# Altium integrated library iMag.IntLib: 35 symbols
Pins are listed as number, name and electrical type; pins without a type are passive.

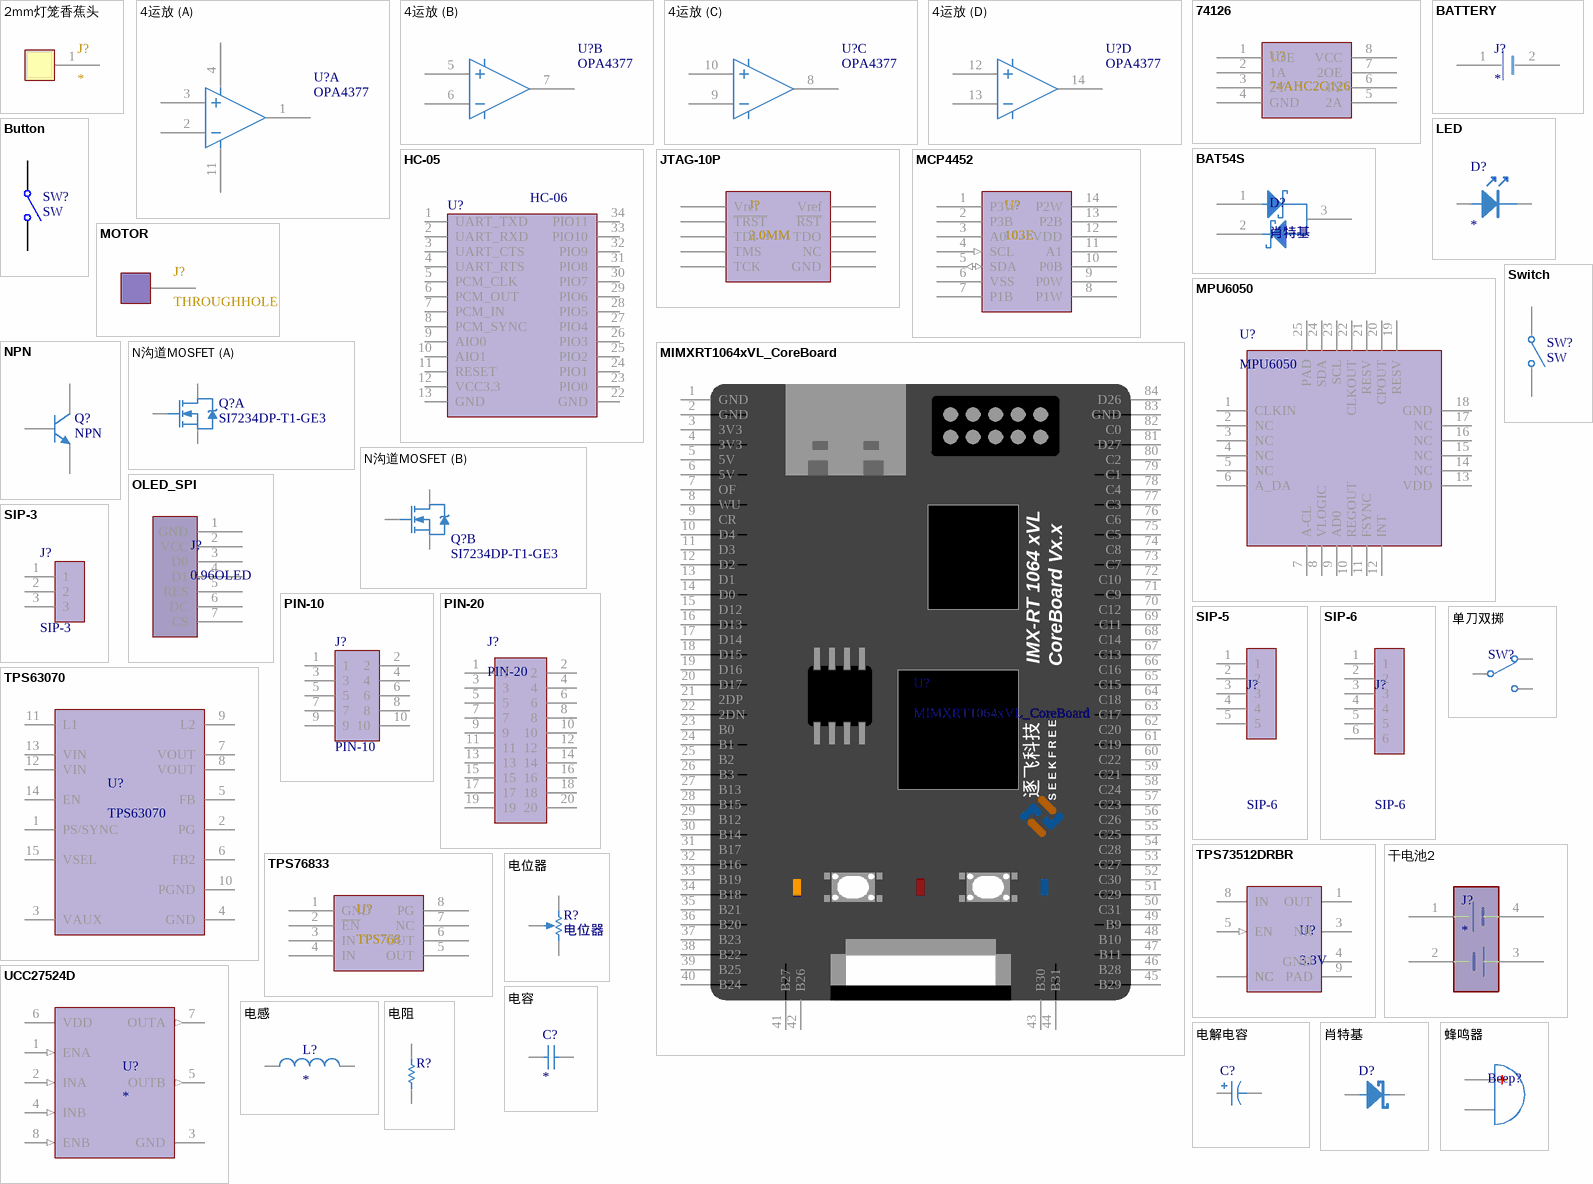
[diagram p0: symbols 2mm灯笼香蕉头 to 蜂鸣器]

## 2mm灯笼香蕉头
designator J?
footprint Model Name (Footprint not found)
footprint MOTOR (镀金香蕉头2mm)
pins: 1 0

## 4运放
designator U?, comment OPA4377
footprint DIP-14
footprint SOIC-14_150MIL
footprint TSSOP-14 (4.96x4.40x1.00 e=0.65（蒜米工坊）)
part A pins: 1, 2, 3, 4, 11
part B pins: 5, 6, 7
part C pins: 8, 9, 10
part D pins: 12, 13, 14

## 74126
designator U?, comment 74AHC2G126
footprint VSSOP-8
pins: 1 1OE, 2 1A, 3 2Y, 4 GND, 5 2A, 6 1Y, 7 2OE, 8 VCC

## BAT54S
designator D?, comment 肖特基
footprint SOT-23 (SOT-23-3)
pins: 1, 2, 3

## BATTERY
designator J?
footprint T接头
pins: 1 +, 2 +

## Button
designator SW?, comment SW
Single-Pole, Single-Throw Switch
footprint 按键微动开关2
footprint 侧按钮
pins: 1 COMMON, 2 NO

## HC-05
designator U?, comment HC-06
蓝牙串口模块
footprint HC-05 (HC-05/06/08V15)
pins: 1 UART_TXD, 2 UART_RXD, 3 UART_CTS, 4 UART_RTS, 5 PCM_CLK, 6 PCM_OUT, 7 PCM_IN, 8 PCM_SYNC, 9 AIO0, 10 AIO1, 11 RESET, 12 VCC3.3, 13 GND, 22 GND, 23 PIO0, 24 PIO1, 25 PIO2, 26 PIO3, 27 PIO4, 28 PIO5, 29 PIO6, 30 PIO7, 31 PIO8, 32 PIO9, 33 PIO10, 34 PIO11

## JTAG-10P
designator J?, comment 2.0MM
footprint IDC-10P
pins: 1 Vref, 2 Vref, 3 ~{TRST}, 4 ~{RST}, 5 TDI, 6 TDO, 7 TMS, 8 NC, 9 TCK, 10 GND

## LED
designator D?
LED
footprint LED 0603B (蓝色0603LED)
footprint LED 0603G (绿色0603LED)
footprint LED 0603R (红色0603LED)
footprint LED 0603W (白色0603LED)
footprint LED 0603Y (黄色0603LED)
footprint LED0805
footprint LED0805红色
footprint LED0805绿色
footprint LED0805黄色
footprint LED-SMD_L1.7-W0.6-RD
pins: A 1, K 2

## MCP4452
designator U?, comment 103E
footprint TSSOP-14 (4.96x4.40x1.00 e=0.65（蒜米工坊）)
pins: 1 P3W, 2 P3B, 3 A0, 4 SCL (in), 5 SDA (io), 6 VSS, 7 P1B, 8 P1W, 9 P0W, 10 P0B, 11 A1, 12 VDD, 13 P2B, 14 P2W

## MIMXRT1064xVL_CoreBoard
designator U?
逐飞科技i.MX RT1064核心板整体原理，可直接使用
footprint MIMXRT1064xVL_CoreBoard (逐飞科技i.MX RT1064核心板整体封装，可直接使用)
pins: 1 GND, 2 GND, 3 3V3, 4 3V3, 5 5V, 6 5V, 7 OF, 8 WU, 9 CR, 10 D4, 11 D3, 12 D2, 13 D1, 14 D0, 15 D12, 16 D13, 17 D14, 18 D15, 19 D16, 20 D17, 21 2DP, 22 2DN, 23 B0, 24 B1, 25 B2, 26 B3, 27 B13, 28 B15, 29 B12, 30 B14, 31 B17, 32 B16, 33 B19, 34 B18, 35 B21, 36 B20, 37 B23, 38 B22, 39 B25, 40 B24, 41 B27, 42 B26, 43 B30, 44 B31, 45 B29, 46 B28, 47 B11, 48 B10, 49 B9, 50 C31, 51 C29, 52 C30, 53 C27, 54 C28, 55 C25, 56 C26, 57 C23, 58 C24, 59 C21, 60 C22, 61 C19, 62 C20, 63 C17, 64 C18, 65 C15, 66 C16, 67 C13, 68 C14, 69 C11, 70 C12, 71 C9, 72 C10, 73 C7, 74 C8, 75 C5, 76 C6, 77 C3, 78 C4, 79 C1, 80 C2, 81 D27, 82 C0, 83 GND, 84 D26
text: IMX-RT 1064 xVL; CoreBoard Vx.x; 逐飞科技; S E E K F R E E

## MOTOR
designator J?, comment THROUGHHOLE
footprint MOTOR (镀金香蕉头2mm)
pins: 1

## MPU6050
designator U?
footprint QFN-24_4x4x05P
pins: 1 CLKIN, 2 NC, 3 NC, 4 NC, 5 NC, 6 A_DA, 7 A-CL, 8 VLOGIC, 9 AD0, 10 REGOUT, 11 FSYNC, 12 INT, 13 VDD, 14 NC, 15 NC, 16 NC, 17 NC, 18 GND, 19 RESV, 20 CPOUT, 21 RESV, 22 CLKOUT, 23 SCL, 24 SDA, 25 PAD

## NPN
designator Q?
NPN Bipolar Transistor; Published: 8-Jun-2000; LatestRevisionDate: 17-Jul-2002; LatestRevisionNote: Re-released for DXP Platform.; PackageReference: TO-226-AA; Publisher: Altium Limited; PackageDescription: TO, Flat Index; 3 In-Line, Axial Leads; Body Dia. 4.8mm; Leads 0.55 x 0.51 mm (max); Code_JEDEC: TO-226-AA
footprint SOT-23 (SOT-23-3)
simulation model NPN
signal-integrity model NPN
pins: 1 B, 2 E, 3 C

## N沟道MOSFET
designator Q?, comment SI7234DP-T1-GE3
CQ-BS170
footprint DFN-8EP2 (DFN-8_L5.5-W5.2-P1.27-LS6.0-BL-EP2)
part A pins: 1 S, 2 G, 6 D
part B pins: 3 S, 4 G, 5 D

## OLED_SPI
designator J?, comment 0.96OLED
footprint OLED 0.96
pins: 1 GND, 2 VCC, 3 D0, 4 D1, 5 RES, 6 DC, 7 CS

## PIN-10
designator J?
footprint 2.54简易牛角座10P
footprint 2.54简易牛角座弯针10P
footprint 2.54母排座双排10P
footprint 2.54弯排针2X5
footprint JTAG_10P
footprint 2.54排针2X5
pins: 1, 2, 3, 4, 5, 6, 7, 8, 9, 10

## PIN-20
designator J?
footprint 2.54排针2X10
footprint 2.54弯排针2X10
footprint 2.54简易牛角座20p
footprint 2.54简易牛角座弯针20P
footprint 2.54母排座双排20P
footprint 4.2接插件20P
footprint IDC-TH_2.0-2*10
pins: 1, 2, 3, 4, 5, 6, 7, 8, 9, 10, 11, 12, 13, 14, 15, 16, 17, 18, 19, 20

## SIP-3
designator J?
footprint 5.08接线端子3位
footprint 5.08接线端子3P
footprint 2.54接插件3P
footprint 2.54接插件3P
footprint 2.54排针1X3
footprint 2.54弯排针1X3-A
footprint 2.54弯排针1X3
footprint 2.54对插件3P
footprint 2.54XH接插件3P
footprint XH2.54-3SMD (CONN-SMD_3P-P2.54_XH2.54-3AB)
pins: 1, 2, 3

## SIP-5
designator J?, comment SIP-6
footprint 2.54排针1X5
pins: 1, 2, 3, 4, 5

## SIP-6
designator J?
footprint 5.08接线端子6位
footprint 5.08接插件6P
footprint 2.54接插件6P
footprint 2.54排针1X6
footprint 2.54弯排针1X6-A
footprint 2.54弯排针1X6
footprint 2.54对插件6P
footprint 2.54XH接插件6P
footprint 2.54简易牛角座6P
pins: 1, 2, 3, 4, 5, 6

## Switch
designator SW?, comment SW
Single-Pole, Single-Throw Switch
footprint 按键微动开关2
footprint 侧按钮
footprint 轻触开关6.2*6.2(5p) SMD
pins: 1 COMMON, 2 NO

## TPS63070
designator U?
footprint VQFN-15
pins: 1 PS/SYNC, 2 PG, 3 VAUX, 4 GND, 5 FB, 6 FB2, 7 VOUT, 8 VOUT, 9 L2, 10 PGND, 11 L1, 12 VIN, 13 VIN, 14 EN, 15 VSEL

## TPS73512DRBR
designator U?, comment 3.3V
No Description Available; PartNumber: TPS73512DRBR; Alternate_PartNumber: TPS73512DRBT; Manufacturer: Texas Instruments; CompType: IC; PIN_COUNT: 9; Application_BuildNumber: *; PackageReference: DRB0008A; MountType: SMT; RoHS: Y; RefDes: RefDes; Type: DEV; Value: Value; Copyright: Copyright (C) 2018 Accelerated Designs. All rights reserved
footprint VSON-8
pins: 1 OUT (power), 2 NC, 3 NR, 4 GND (power), 5 EN (in), 6 NC, 7 NC, 8 IN (power), 9 PAD (power)

## TPS76833
designator U?, comment TPS768
footprint SOIC8-3.9MM
pins: 1 GND, 2 ~{EN}, 3 IN, 4 IN, 5 OUT, 6 OUT, 7 NC, 8 PG

## UCC27524D
designator U?
No Description Available; PartNumber: UCC27524DR; Manufacturer: Texas Instruments; RefDes: RefDes; Type: DEV; Value: Value; Copyright: Copyright (C) 2018 Accelerated Designs. All rights reserved
footprint D0008A_N
footprint TSSOP-8EP (TSSOP-8_L3.0-W3.0-P0.65-LS4.9-BL-EP)
pins: 1 ENA (in), 2 INA (in), 3 GND (power), 4 INB (in), 5 OUTB (out), 6 VDD (power), 7 OUTA (out), 8 ENB (in)

## 单刀双掷
designator SW?, comment K3-1235S-K1  (value not drawn)
Switch
footprint K3-1235S-K1
footprint SW-TH_3PIN_SK12D07VG4
footprint SW-TH_3PIN_SK12D07VG4 - duplicate
pins: 1, 2, 3

## 干电池2
designator J?
footprint 18650x2 (2节电池座)
pins: 1 +, 2 +, 3 +, 4 +

## 电位器
designator R?
footprint 3296W
pins: 1 TOP, 2 TAP, 3 BOT

## 电容
designator C?
Capacitor; Value: 22pF; Published: 8-Jun-2000; LatestRevisionDate: 17-Jul-2002; LatestRevisionNote: Re-released for DXP Platform.; PackageReference: RAD-0.3; Publisher: Altium Limited; PackageDescription: Radial Cap, Thru-Hole; 2 Leads; 0.3 in Pin Spacing
footprint C1206 (3216/A型)
footprint C0603
footprint 0805C
footprint 1.5CM (CBB)
footprint 5mm (插件)
footprint 120603 (兼容)
footprint C0402
pins: 1, 2

## 电感
designator L?
footprint L5X4
footprint L5X5
footprint L7X7 (POWER INDUCTOR 5uH)
footprint L10X10
footprint L12X12
footprint L25X25
footprint L0402 (1/16W)
footprint L0603
footprint L0805 (1/8W)
footprint L1008 (2520)
footprint L1206 (1/4W)
footprint L1210
footprint L1808
footprint L1812
footprint L2220
footprint L2525
footprint 120603 (兼容)
pins: 1, 2

## 电解电容
designator C?
Polarized Capacitor (Axial); Value: 100pF; Published: 8-Jun-2000; LatestRevisionDate: 17-Jul-2002; LatestRevisionNote: Re-released for DXP Platform.; PackageReference: POLAR0.8; Publisher: Altium Limited; PackageDescription: Polarized Capacitor; 2 Leads
simulation model CAP (Capacitor)
signal-integrity model Cap Pol
footprint 5mm (插件)
footprint 贴片电解 8*10.2
footprint 贴片电解 6.3*5.4
footprint 贴片电解 10*10.5
footprint 贴片电解 4*5.4
footprint 3216-ce
footprint 3528-CE
footprint 6032-CE
footprint 7243-CE
pins: 1, 2
1 alternate drawing of the same symbol

## 电阻
designator R?
Resistor; Value: 150R; Published: 8-Jun-2000; LatestRevisionDate: 17-Jul-2002; LatestRevisionNote: Re-released for DXP Platform.; PackageReference: AXIAL-0.3; Publisher: Altium Limited; PackageDescription: Axial Device, Thru-Hole; 2 Leads; 0.3 in Pin Spacing
footprint R1206 (1/4W)
footprint 大
footprint R0402 (1/16W)
footprint R0603 (1/10W)
footprint R2512
footprint 120603 (兼容)
footprint R0805 (1/8W)
footprint R1812
footprint R2010
pins: 1, 2

## 肖特基
designator D?
Schottky Diode
footprint DO-35
footprint SMA (DO-214AC)
footprint DO-214AC（SMA）
footprint SOD-123F (2.7x1.6X1.1mm（长宽高，不包括引脚）)
pins: 1 A, 2 K

## 蜂鸣器
designator Beep?  (value not drawn)
footprint SMD-BUZZER-9.6X9.6X5
footprint Beep-5.0*5.0
pins: 1 A, 2 B